# Altium footprint library vestibular_vampire.PcbLib: 82 footprints (part 6 of 6)
Each footprint in its own frame and in the unit in brackets; x right, y up, seen from the top. Pads: shape width x height; smd on the part's side, far side on the other; paste and mask are expansions set on the pad; w line width, h text height; cw(c..) or ccw(c..) is an arc to the next point about the centre after c.
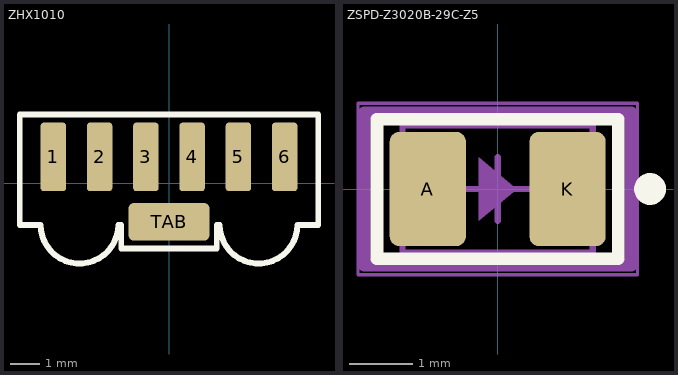
[diagram p5: the footprints below, top view; thin cyan lines are the x and y axes]

## ZHX1010 [mm] "IrDA Transceiver"
pads (7):
  rrect25% 0.85x2.3 smd: 1(-3.875,0.875) 2(-2.325,0.875) 3(-0.775,0.875) 4(0.775,0.875) 5(2.325,0.875) 6(3.875,0.875)
  rrect25% 2.7x1.25 smd: TAB(0,-1.3)
Top Overlay:
  lines w0.2: -5,-1.4 -5,2.3 5,2.3 5,-1.4 4.3,-1.4 cw(c3,-1.4) 1.7,-1.4 1.6,-1.4 1.6,-2.2 -1.6,-2.2 -1.6,-1.4 -1.7,-1.4 cw(c-3,-1.4) -4.3,-1.4 -5,-1.4
3D body "zhx1010mv115th_irda.sldprt": height 4.07, standoff 0, extent -4.985,-2.725 4.985,1.085

## ZSPD-Z3020B-29C-Z5 [mm]
pads (2):
  rrect25% 1.2x1.8 smd: A(-1.1,0) K(1.1,0)
Top Overlay:
  circle w0.25: c2.4,0 r0.125
  lines w0.2: -1.9,-1.1 -1.9,1.1 1.9,1.1 1.9,-1.1 -1.9,-1.1
Mechanical 1:
  region: 0.3,0 -0.3,-0.5 -0.3,0.5
  lines w0.2: -2.1,-1.2 2.1,-1.2 2.1,1.2 -2.1,1.2 -2.1,-1.2
Mechanical 13:
  lines w0.1: -1.5,-1 1.5,-1 1.5,1 -1.5,1 -1.5,-1
Mechanical 15:
  lines w0.05: -2.2,-1.35 2.2,-1.35 2.2,1.35 -2.2,1.35 -2.2,-1.35
  lines w0.1: -0.5,0 0.5,0 ; 0,-0.5 0,0.5
3D body "zspd-z3020b-29c-z5.sldprt": height 2.9, standoff 0, extent -1.5,-1 1.5,1